# Altium footprint library PFC_Stage.PcbLib: 60 footprints (part 4 of 4)
Each footprint in its own frame and in the unit in brackets; x right, y up, seen from the top. Pads: shape width x height; smd on the part's side, far side on the other; paste and mask are expansions set on the pad; w line width, h text height; cw(c..) or ccw(c..) is an arc to the next point about the centre after c.
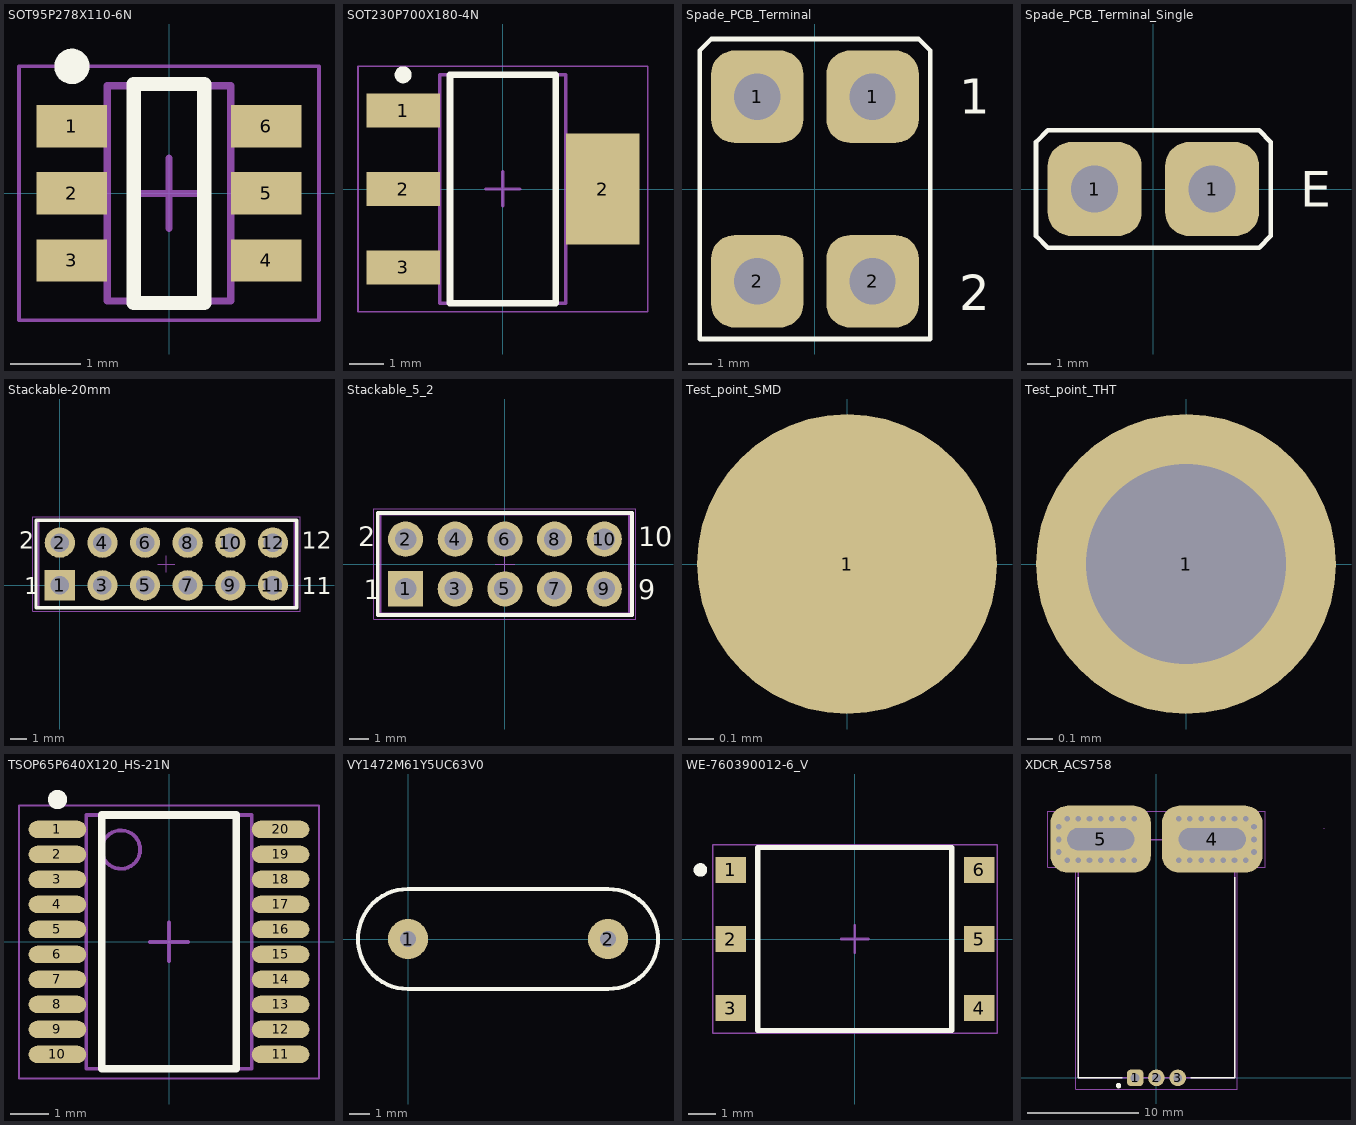
[diagram p3: the footprints below, top view; thin cyan lines are the x and y axes]

## SOT95P278X110-6N [mm] "SOT23, 6-Leads, Body 2.90x2.78mm, Pitch 0.95mm, IPC Medium Density"
height 1.1
pads (6):
  rect 1x0.6 smd: 1(-1.375,0.95) 2(-1.375,0) 3(-1.375,-0.95) 4(1.375,-0.95) 5(1.375,0) 6(1.375,0.95)
Top Overlay:
  circle w0.25: c-1.375,1.8 r0.125
  lines w0.2: -0.5,-1.55 -0.5,1.55 0.5,1.55 0.5,-1.55 -0.5,-1.55
Mechanical 13:
  lines w0.1: -0.875,-1.525 0.875,-1.525 0.875,1.525 -0.875,1.525 -0.875,-1.525
Mechanical 15:
  lines w0.05: -2.125,-1.8 2.125,-1.8 2.125,1.8 -2.125,1.8 -2.125,-1.8
  lines w0.1: -0.5,0 0.5,0 ; 0,-0.5 0,0.5
3D body "SOT95P278X110-6N.step": height 1.1, standoff 0, extent -1.525,-1.525 1.525,1.525

## SOT230P700X180-4N [mm] "SOT223, 4-Leads, Body 6.50x7.00mm (avg), Pitch 2.30mm, IPC Medium Density"
height 1.8
pads (4):
  rect 2.15x1 smd: 1(-2.925,2.3) 2(-2.925,0) 3(-2.925,-2.3)
  rect 2.15x3.25 smd: 2(2.925,0)
Top Overlay:
  circle w0.25: c-2.925,3.35 r0.125
  lines w0.2: -1.55,-3.35 -1.55,3.35 1.55,3.35 1.55,-3.35 -1.55,-3.35
Mechanical 13:
  lines w0.1: -1.85,-3.35 -1.85,3.35 1.85,3.35 1.85,-3.35 -1.85,-3.35
Mechanical 15:
  lines w0.05: -4.25,-3.6 -4.25,3.6 4.25,3.6 4.25,-3.6 -4.25,-3.6
  lines w0.1: -0.5,0 0.5,0 ; 0,-0.5 0,0.5
3D body "SOT230P700X180-4N.step": height 1.8, standoff 0, extent -3.5,-3.35 3.5,3.35

## Spade_PCB_Terminal [mm]
pads (4):
  rrect50% 4x4 hole 2: 1(-2.5,4) 1(2.5,4) 2(-2.5,-4) 2(2.5,-4)
Top Overlay:
  lines w0.2: -5,-6.5 -5,4.5 -5,6 -4.5,6.5 4.5,6.5 5,6 5,-6.5 4.5,-6.5 -4.5,-6.5 -5,-6.5
  text "2" at 6.254,-5.246 h1.52
  text "1" at 6.254,3.254 h1.52
3D body "c-725964-2-d-3d_color.STEP": height 14, standoff -2.5, extent -4.1,-4.4 3.9,-3.6
3D body "c-725964-2-d-3d_color.STEP": height 14, standoff -2.5, extent -4,3.5 4,4.3

## Spade_PCB_Terminal_Single [mm]
pads (2):
  rrect50% 4x4 hole 2: 1(-2.5,0) 1(2.5,0)
Top Overlay:
  lines w0.2: -5,-2 -5,0.5 -5,2 -4.5,2.5 4.5,2.5 5,2 5,-2 4.5,-2.5 -4.5,-2.5 -5,-2
  text "E" at 6.254,-0.746 h1.52
3D body "c-725964-2-d-3d_color.STEP": height 14, standoff -2.5, extent -4,-0.5 4,0.3

## Stackable-20mm [mm] "Pin Header, pitch 2.54 mm, THT, Vertical, dual row, 12p"
height 8.54
pads (12):
  rect 1.8x1.8 hole 1.1: 1(0,0)
  round 1.8 hole 1.1: 2(0,2.54) 3(2.54,0) 4(2.54,2.54) 5(5.08,0) 6(5.08,2.54) 7(7.62,0) 8(7.62,2.54) 9(10.16,0) 10(10.16,2.54) 11(12.7,0) 12(12.7,2.54)
Top Overlay:
  lines w0.2: -1.42,-1.345 -1.42,3.885 14.12,3.885 14.12,-1.345 -1.42,-1.345
  text "12" at 14.43,2.17 h1.02
  text "11" at 14.43,-0.53 h1.02
  text "1" at -2.13,-0.53 h1.02
  text "2" at -2.43,2.17 h1.02
Mechanical 13:
  lines w0.1: -1.27,-1.27 -1.27,3.81 13.97,3.81 13.97,-1.27 -1.27,-1.27
Mechanical 15:
  lines w0.05: 5.85,1.27 6.85,1.27 ; 6.35,0.77 6.35,1.77 ; -1.62,-1.545 14.32,-1.545 14.32,4.085 -1.62,4.085 -1.62,-1.545
3D body "24mm_6_pin.x_t": height 23.12, standoff -1.12, extent -1.27,-1.27 13.97,3.81

## Stackable_5_2 [mm] "Pin Header, pitch 2.54 mm, THT, Vertical, dual row, 10p"
height 8.54
pads (10):
  rect 1.8x1.8 hole 1.1: 1(-5.08,-1.27)
  round 1.8 hole 1.1: 2(-5.08,1.27) 3(-2.54,-1.27) 4(-2.54,1.27) 5(0,-1.27) 6(0,1.27) 7(2.54,-1.27) 8(2.54,1.27) 9(5.08,-1.27) 10(5.08,1.27)
Top Overlay:
  lines w0.2: -6.5,-2.615 6.5,-2.615 6.5,2.615 -6.5,2.615 -6.5,-2.615
  text "2" at -7.51,0.9 h1.02
  text "1" at -7.21,-1.8 h1.02
  text "9" at 6.81,-1.8 h1.02
  text "10" at 6.81,0.9 h1.02
Mechanical 13:
  lines w0.1: -6.35,-2.54 6.35,-2.54 6.35,2.54 -6.35,2.54 -6.35,-2.54
Mechanical 15:
  lines w0.05: -0.5,0 0.5,0 ; 0,-0.5 0,0.5 ; -6.7,-2.815 -6.7,2.815 6.7,2.815 6.7,-2.815 -6.7,-2.815
3D body "61306428521_10.STEP": height 36.59, standoff -2.89, extent -6.35,-2.5 6.35,2.58

## Test_point_SMD [mm]
pads (1):
  round 1.2 smd: 1(0,0)

## Test_point_THT [mm]
pads (1):
  round 1.2 hole 0.8: 1(0,0)

## TSOP65P640X120_HS-21N [mm] "TSOP, 20-Leads, Body 6.50x4.40mm, Pitch 0.65mm, Thermal Pad 5.00x2.00mm, IPC Medium Density"
height 1.2
pads (20):
  oval 1.5x0.45 smd: 1(-2.9,2.925) 2(-2.9,2.275) 3(-2.9,1.625) 4(-2.9,0.975) 5(-2.9,0.325) 6(-2.9,-0.325) 7(-2.9,-0.975) 8(-2.9,-1.625) 9(-2.9,-2.275) 10(-2.9,-2.925) 11(2.9,-2.925) 12(2.9,-2.275) 13(2.9,-1.625) 14(2.9,-0.975) 15(2.9,-0.325) 16(2.9,0.325) 17(2.9,0.975) 18(2.9,1.625) 19(2.9,2.275) 20(2.9,2.925)
Top Overlay:
  circle w0.25: c-2.9,3.7 r0.125
  lines w0.2: -1.75,-3.3 1.75,-3.3 1.75,3.3 -1.75,3.3 -1.75,-3.3
Mechanical 13:
  circle w0.1: c-1.25,2.4 r0.5
  lines w0.1: -2.15,-3.3 2.15,-3.3 2.15,3.3 -2.15,3.3 -2.15,-3.3
Mechanical 15:
  lines w0.05: -3.9,-3.55 3.9,-3.55 3.9,3.55 -3.9,3.55 -3.9,-3.55
  lines w0.1: -0.5,0 0.5,0 ; 0,-0.5 0,0.5
3D body "TSOP65P640X120_HS-21N.step": height 1.2, standoff 0, extent -3.2,-3.3 3.2,3.3

## VY1472M61Y5UC63V0 [mm]
pads (2):
  round 2 hole 0.8: 1(0,0) 2(10,0)
Top Overlay:
  lines w0.2: 0,-2.5 cw(c0,0) 0,2.5 10,2.5 cw(c10,0) 10,-2.5 0,-2.5
3D body "VY1472M61Y5UC63V0.stp": height 27.75, standoff -21.75, extent -2.748,-2.5 12.749,2.5

## WE-760390012-6_V [mm] "SMD, 6-Leads, Body 7.14x6.73mm, Pitch 2.54mm"
height 4.19
pads (6):
  rect 1.12x0.96 smd: 1(-4.57,2.54) 2(-4.57,0) 3(-4.57,-2.54) 4(4.57,-2.54) 5(4.57,0) 6(4.57,2.54)
Top Overlay:
  circle w0.25: c-5.68,2.54 r0.125
  lines w0.2: -3.57,-3.365 3.57,-3.365 3.57,3.365 -3.57,3.365 -3.57,-3.365
Mechanical 13:
  lines w0.1: -3.57,-3.365 -3.57,3.365 3.57,3.365 3.57,-3.365 -3.57,-3.365
Mechanical 15:
  lines w0.05: -5.23,-3.465 5.23,-3.465 5.23,3.465 -5.23,3.465 -5.23,-3.465
  lines w0.1: -0.5,0 0.5,0 ; 0,-0.5 0,0.5
3D body "760390012_Download_STP_250-1109_rev1.STEP": height 3.92, standoff -0.14, extent -5.005,-3.25 4.955,3.23

## XDCR_ACS758 [mm]
pads (5):
  rrect50% 1.5x1.5 hole 0.8: 1(-1.91,0)
  round 1.5 hole 0.8: 2(0,0) 3(1.91,0)
  rrect50% 9x6 hole 2 slot 6 at 0 deg: 4(5,21.4) 5(-5,21.4)
via 8.75,21.375 diameter 1.27 hole 0.5
via 8.75,20.25 diameter 1.27 hole 0.5
via 8.75,22.5 diameter 1.27 hole 0.5
via -8.75,21.375 diameter 1.27 hole 0.5
via -2,19.5 diameter 1.27 hole 0.5
via -8.75,20.25 diameter 1.27 hole 0.5
via -8,19.5 diameter 1.27 hole 0.5
via -3,19.5 diameter 1.27 hole 0.5
via -4,19.5 diameter 1.27 hole 0.5
via -5,19.5 diameter 1.27 hole 0.5
via -6,19.5 diameter 1.27 hole 0.5
via -7,19.5 diameter 1.27 hole 0.5
via -8.75,22.5 diameter 1.27 hole 0.5
via -2,23.25 diameter 1.27 hole 0.5
via -8,23.25 diameter 1.27 hole 0.5
via -7,23.25 diameter 1.27 hole 0.5
via -6,23.25 diameter 1.27 hole 0.5
via -3,23.25 diameter 1.27 hole 0.5
via -4,23.25 diameter 1.27 hole 0.5
via -5,23.25 diameter 1.27 hole 0.5
via 5,23.25 diameter 1.27 hole 0.5
via 6,23.25 diameter 1.27 hole 0.5
via 7,23.25 diameter 1.27 hole 0.5
via 8,23.25 diameter 1.27 hole 0.5
via 4,23.25 diameter 1.27 hole 0.5
via 3,23.25 diameter 1.27 hole 0.5
via 2,23.25 diameter 1.27 hole 0.5
via 2,19.5 diameter 1.27 hole 0.5
via 3,19.5 diameter 1.27 hole 0.5
via 4,19.5 diameter 1.27 hole 0.5
via 5,19.5 diameter 1.27 hole 0.5
via 6,19.5 diameter 1.27 hole 0.5
via 7,19.5 diameter 1.27 hole 0.5
via 8,19.5 diameter 1.27 hole 0.5
Top Overlay:
  circle w0.24: c-3.4,-0.7 r0.12
  lines w0.127: -7,18 -7,0 -3.06,0 ; 3.06,0 7,0 7,18
Mechanical 1:
  lines w0: -5,22.4 -4.95,22.4 ; 5,22.4 5.05,22.4 ; 15,22.4 15.05,22.4 ; -7,20.4 cw(c-7,21.4) -7,22.4 -3,22.4 cw(c-3,21.4) -3,20.4 -7,20.4 ; 3,20.4 cw(c3,21.4) 3,22.4 7,22.4 cw(c7,21.4) 7,20.4 3,20.4
Mechanical 13:
  lines w0.127: -7,0 7,0 7,21.341 -7,21.341 -7,0
Mechanical 15:
  lines w0.05: -9.75,18.9 -9.75,23.9 9.75,23.9 9.75,18.9 7.25,18.9 7.25,-1 -7.25,-1 -7.25,18.9 -9.75,18.9
3D body "ACS758.STEP": height 7, standoff -3.5, extent -7,-0.1 7,22.25